# Altium footprint library IC.PcbLib: 386 footprints (part 6 of 30)
Each footprint in its own frame and in the unit in brackets; x right, y up, seen from the top. Pads: shape width x height; smd on the part's side, far side on the other; paste and mask are expansions set on the pad; w line width, h text height; cw(c..) or ccw(c..) is an arc to the next point about the centre after c.
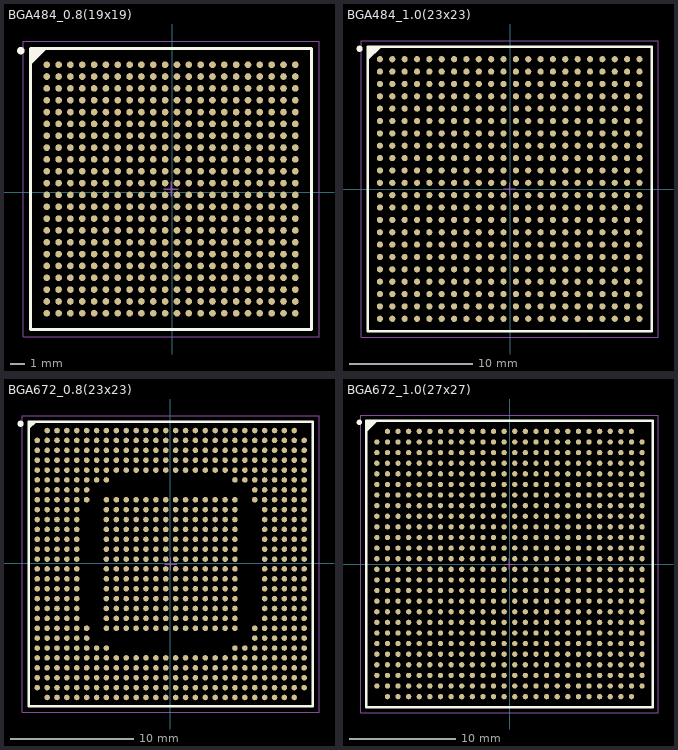
[diagram p5: the footprints below, top view; thin cyan lines are the x and y axes]

## BGA484_0.8(19x19) [mm]
height 1
pads (484):
  round 0.45 smd: A1(-8.476,8.603) A2(-7.676,8.603) A3(-6.876,8.603) A4(-6.076,8.603) A5(-5.276,8.603) A6(-4.476,8.603) A7(-3.676,8.603) A8(-2.876,8.603) A9(-2.076,8.603) A10(-1.276,8.603) A11(-0.476,8.603) A12(0.324,8.603) A13(1.124,8.603) A14(1.924,8.603) A15(2.724,8.603) A16(3.524,8.603) A17(4.324,8.603) A18(5.124,8.603) A19(5.924,8.603) A20(6.724,8.603) A21(7.524,8.603) A22(8.324,8.603) AA1(-8.476,-7.397) AA2(-7.676,-7.397) AA3(-6.876,-7.397) AA4(-6.076,-7.397) AA5(-5.276,-7.397) AA6(-4.476,-7.397) AA7(-3.676,-7.397) AA8(-2.876,-7.397) AA9(-2.076,-7.397) AA10(-1.276,-7.397) AA11(-0.476,-7.397) AA12(0.324,-7.397) AA13(1.124,-7.397) AA14(1.924,-7.397) AA15(2.724,-7.397) AA16(3.524,-7.397) AA17(4.324,-7.397) AA18(5.124,-7.397) AA19(5.924,-7.397) AA20(6.724,-7.397) AA21(7.524,-7.397) AA22(8.324,-7.397) AB1(-8.476,-8.197) AB2(-7.676,-8.197) AB3(-6.876,-8.197) AB4(-6.076,-8.197) AB5(-5.276,-8.197) AB6(-4.476,-8.197) AB7(-3.676,-8.197) AB8(-2.876,-8.197) AB9(-2.076,-8.197) AB10(-1.276,-8.197) AB11(-0.476,-8.197) AB12(0.324,-8.197) AB13(1.124,-8.197) AB14(1.924,-8.197) AB15(2.724,-8.197) AB16(3.524,-8.197) AB17(4.324,-8.197) AB18(5.124,-8.197) AB19(5.924,-8.197) AB20(6.724,-8.197) AB21(7.524,-8.197) AB22(8.324,-8.197) B1(-8.476,7.803) B2(-7.676,7.803) B3(-6.876,7.803) B4(-6.076,7.803) B5(-5.276,7.803) B6(-4.476,7.803) B7(-3.676,7.803) B8(-2.876,7.803) B9(-2.076,7.803) B10(-1.276,7.803) B11(-0.476,7.803) B12(0.324,7.803) B13(1.124,7.803) B14(1.924,7.803) B15(2.724,7.803) B16(3.524,7.803) B17(4.324,7.803) B18(5.124,7.803) B19(5.924,7.803) B20(6.724,7.803) B21(7.524,7.803) B22(8.324,7.803) C1(-8.476,7.003) C2(-7.676,7.003) C3(-6.876,7.003) C4(-6.076,7.003) C5(-5.276,7.003) C6(-4.476,7.003) C7(-3.676,7.003) C8(-2.876,7.003) C9(-2.076,7.003) C10(-1.276,7.003) C11(-0.476,7.003) C12(0.324,7.003) C13(1.124,7.003) C14(1.924,7.003) C15(2.724,7.003) C16(3.524,7.003) C17(4.324,7.003) C18(5.124,7.003) C19(5.924,7.003) C20(6.724,7.003) C21(7.524,7.003) C22(8.324,7.003) D1(-8.476,6.203) D2(-7.676,6.203) D3(-6.876,6.203) D4(-6.076,6.203) D5(-5.276,6.203) D6(-4.476,6.203) D7(-3.676,6.203) D8(-2.876,6.203) D9(-2.076,6.203) D10(-1.276,6.203) D11(-0.476,6.203) D12(0.324,6.203) D13(1.124,6.203) D14(1.924,6.203) D15(2.724,6.203) D16(3.524,6.203) D17(4.324,6.203) D18(5.124,6.203) D19(5.924,6.203) D20(6.724,6.203) D21(7.524,6.203) D22(8.324,6.203) E1(-8.476,5.403) E2(-7.676,5.403) E3(-6.876,5.403) E4(-6.076,5.403) E5(-5.276,5.403) E6(-4.476,5.403) E7(-3.676,5.403) E8(-2.876,5.403) E9(-2.076,5.403) E10(-1.276,5.403) E11(-0.476,5.403) E12(0.324,5.403) E13(1.124,5.403) E14(1.924,5.403) E15(2.724,5.403) E16(3.524,5.403) E17(4.324,5.403) E18(5.124,5.403) E19(5.924,5.403) E20(6.724,5.403) E21(7.524,5.403) E22(8.324,5.403) F1(-8.476,4.603) F2(-7.676,4.603) F3(-6.876,4.603) F4(-6.076,4.603) F5(-5.276,4.603) F6(-4.476,4.603) F7(-3.676,4.603) F8(-2.876,4.603) F9(-2.076,4.603) F10(-1.276,4.603) F11(-0.476,4.603) F12(0.324,4.603) F13(1.124,4.603) F14(1.924,4.603) F15(2.724,4.603) F16(3.524,4.603) F17(4.324,4.603) F18(5.124,4.603) F19(5.924,4.603) F20(6.724,4.603) F21(7.524,4.603) F22(8.324,4.603) G1(-8.476,3.803) G2(-7.676,3.803) G3(-6.876,3.803) G4(-6.076,3.803) G5(-5.276,3.803) G6(-4.476,3.803) G7(-3.676,3.803) G8(-2.876,3.803) G9(-2.076,3.803) G10(-1.276,3.803) G11(-0.476,3.803) G12(0.324,3.803) G13(1.124,3.803) G14(1.924,3.803) G15(2.724,3.803) G16(3.524,3.803) G17(4.324,3.803) G18(5.124,3.803) G19(5.924,3.803) G20(6.724,3.803) G21(7.524,3.803) G22(8.324,3.803) H1(-8.476,3.003) H2(-7.676,3.003) H3(-6.876,3.003) H4(-6.076,3.003) H5(-5.276,3.003) H6(-4.476,3.003) H7(-3.676,3.003) H8(-2.876,3.003) H9(-2.076,3.003) H10(-1.276,3.003) H11(-0.476,3.003) H12(0.324,3.003) H13(1.124,3.003) H14(1.924,3.003) H15(2.724,3.003) H16(3.524,3.003) H17(4.324,3.003) H18(5.124,3.003) H19(5.924,3.003) H20(6.724,3.003) H21(7.524,3.003) H22(8.324,3.003) J1(-8.476,2.203) J2(-7.676,2.203) J3(-6.876,2.203) J4(-6.076,2.203) J5(-5.276,2.203) J6(-4.476,2.203) J7(-3.676,2.203) J8(-2.876,2.203) J9(-2.076,2.203) J10(-1.276,2.203) J11(-0.476,2.203) J12(0.324,2.203) J13(1.124,2.203) J14(1.924,2.203) J15(2.724,2.203) J16(3.524,2.203) J17(4.324,2.203) J18(5.124,2.203) J19(5.924,2.203) J20(6.724,2.203) J21(7.524,2.203) J22(8.324,2.203) K1(-8.476,1.403) K2(-7.676,1.403) K3(-6.876,1.403) K4(-6.076,1.403) K5(-5.276,1.403) K6(-4.476,1.403) K7(-3.676,1.403) K8(-2.876,1.403) K9(-2.076,1.403) K10(-1.276,1.403) K11(-0.476,1.403) K12(0.324,1.403) K13(1.124,1.403) K14(1.924,1.403) K15(2.724,1.403) K16(3.524,1.403) K17(4.324,1.403) K18(5.124,1.403) K19(5.924,1.403) K20(6.724,1.403) K21(7.524,1.403) K22(8.324,1.403) L1(-8.476,0.603) L2(-7.676,0.603) L3(-6.876,0.603) L4(-6.076,0.603) L5(-5.276,0.603) L6(-4.476,0.603) L7(-3.676,0.603) L8(-2.876,0.603) L9(-2.076,0.603) L10(-1.276,0.603) L11(-0.476,0.603) L12(0.324,0.603) L13(1.124,0.603) L14(1.924,0.603) L15(2.724,0.603) L16(3.524,0.603) L17(4.324,0.603) L18(5.124,0.603) L19(5.924,0.603) L20(6.724,0.603) L21(7.524,0.603) L22(8.324,0.603) M1(-8.476,-0.197) M2(-7.676,-0.197) M3(-6.876,-0.197) M4(-6.076,-0.197) M5(-5.276,-0.197) M6(-4.476,-0.197) M7(-3.676,-0.197) M8(-2.876,-0.197) M9(-2.076,-0.197) M10(-1.276,-0.197) M11(-0.476,-0.197) M12(0.324,-0.197) M13(1.124,-0.197) M14(1.924,-0.197) M15(2.724,-0.197) M16(3.524,-0.197) M17(4.324,-0.197) M18(5.124,-0.197) M19(5.924,-0.197) M20(6.724,-0.197) M21(7.524,-0.197) M22(8.324,-0.197) N1(-8.476,-0.997) N2(-7.676,-0.997) N3(-6.876,-0.997) N4(-6.076,-0.997) N5(-5.276,-0.997) N6(-4.476,-0.997) N7(-3.676,-0.997) N8(-2.876,-0.997) N9(-2.076,-0.997) N10(-1.276,-0.997) N11(-0.476,-0.997) N12(0.324,-0.997) N13(1.124,-0.997) N14(1.924,-0.997) N15(2.724,-0.997) N16(3.524,-0.997) N17(4.324,-0.997) N18(5.124,-0.997) N19(5.924,-0.997) N20(6.724,-0.997) N21(7.524,-0.997) N22(8.324,-0.997) P1(-8.476,-1.797) P2(-7.676,-1.797) P3(-6.876,-1.797) P4(-6.076,-1.797) P5(-5.276,-1.797) P6(-4.476,-1.797) P7(-3.676,-1.797) P8(-2.876,-1.797) P9(-2.076,-1.797) P10(-1.276,-1.797) P11(-0.476,-1.797) P12(0.324,-1.797) P13(1.124,-1.797) P14(1.924,-1.797) P15(2.724,-1.797) P16(3.524,-1.797) P17(4.324,-1.797) P18(5.124,-1.797) P19(5.924,-1.797) P20(6.724,-1.797) P21(7.524,-1.797) P22(8.324,-1.797) R1(-8.476,-2.597) R2(-7.676,-2.597) R3(-6.876,-2.597) R4(-6.076,-2.597) R5(-5.276,-2.597) R6(-4.476,-2.597) R7(-3.676,-2.597) R8(-2.876,-2.597) R9(-2.076,-2.597) R10(-1.276,-2.597) R11(-0.476,-2.597) R12(0.324,-2.597) R13(1.124,-2.597) R14(1.924,-2.597) R15(2.724,-2.597) R16(3.524,-2.597) R17(4.324,-2.597) R18(5.124,-2.597) R19(5.924,-2.597) R20(6.724,-2.597) R21(7.524,-2.597) R22(8.324,-2.597) T1(-8.476,-3.397) T2(-7.676,-3.397) T3(-6.876,-3.397) T4(-6.076,-3.397) T5(-5.276,-3.397) T6(-4.476,-3.397) T7(-3.676,-3.397) T8(-2.876,-3.397) T9(-2.076,-3.397) T10(-1.276,-3.397) T11(-0.476,-3.397) T12(0.324,-3.397) T13(1.124,-3.397) T14(1.924,-3.397) T15(2.724,-3.397) T16(3.524,-3.397) T17(4.324,-3.397) T18(5.124,-3.397) T19(5.924,-3.397) T20(6.724,-3.397) T21(7.524,-3.397) T22(8.324,-3.397) U1(-8.476,-4.197) U2(-7.676,-4.197) U3(-6.876,-4.197) U4(-6.076,-4.197) U5(-5.276,-4.197) U6(-4.476,-4.197) U7(-3.676,-4.197) U8(-2.876,-4.197) U9(-2.076,-4.197) U10(-1.276,-4.197) U11(-0.476,-4.197) U12(0.324,-4.197) U13(1.124,-4.197) U14(1.924,-4.197) U15(2.724,-4.197) U16(3.524,-4.197) U17(4.324,-4.197) U18(5.124,-4.197) U19(5.924,-4.197) U20(6.724,-4.197) U21(7.524,-4.197) U22(8.324,-4.197) V1(-8.476,-4.997) V2(-7.676,-4.997) V3(-6.876,-4.997) V4(-6.076,-4.997) V5(-5.276,-4.997) V6(-4.476,-4.997) V7(-3.676,-4.997) V8(-2.876,-4.997) V9(-2.076,-4.997) V10(-1.276,-4.997) V11(-0.476,-4.997) V12(0.324,-4.997) V13(1.124,-4.997) V14(1.924,-4.997) V15(2.724,-4.997) V16(3.524,-4.997) V17(4.324,-4.997) V18(5.124,-4.997) V19(5.924,-4.997) V20(6.724,-4.997) V21(7.524,-4.997) V22(8.324,-4.997) W1(-8.476,-5.797) W2(-7.676,-5.797) W3(-6.876,-5.797) W4(-6.076,-5.797) W5(-5.276,-5.797) W6(-4.476,-5.797) W7(-3.676,-5.797) W8(-2.876,-5.797) W9(-2.076,-5.797) W10(-1.276,-5.797) W11(-0.476,-5.797) W12(0.324,-5.797) W13(1.124,-5.797) W14(1.924,-5.797) W15(2.724,-5.797) W16(3.524,-5.797) W17(4.324,-5.797) W18(5.124,-5.797) W19(5.924,-5.797) W20(6.724,-5.797) W21(7.524,-5.797) W22(8.324,-5.797) Y1(-8.476,-6.597) Y2(-7.676,-6.597) Y3(-6.876,-6.597) Y4(-6.076,-6.597) Y5(-5.276,-6.597) Y6(-4.476,-6.597) Y7(-3.676,-6.597) Y8(-2.876,-6.597) Y9(-2.076,-6.597) Y10(-1.276,-6.597) Y11(-0.476,-6.597) Y12(0.324,-6.597) Y13(1.124,-6.597) Y14(1.924,-6.597) Y15(2.724,-6.597) Y16(3.524,-6.597) Y17(4.324,-6.597) Y18(5.124,-6.597) Y19(5.924,-6.597) Y20(6.724,-6.597) Y21(7.524,-6.597) Y22(8.324,-6.597)
Top Overlay:
  circle w0.25: c-10.226,9.553 r0.125
  region: -8.576,9.703 -9.576,8.703 -9.576,9.703
  lines w0.2: -9.576,8.703 -8.576,9.703 ; -9.576,-9.297 9.424,-9.297 9.424,9.703 -9.576,9.703 -9.576,-9.297
Mechanical 13:
  lines w0.1: -9.576,-9.297 9.424,-9.297 9.424,9.703 -9.576,9.703 -9.576,-9.297
Mechanical 15:
  lines w0.05: -10.076,-9.797 9.924,-9.797 9.924,10.203 -10.076,10.203 -10.076,-9.797
  lines w0.1: -0.576,0.203 0.424,0.203 ; -0.076,-0.297 -0.076,0.703
3D body "User Library-XC7Z030-1SBG485I.step": height 2.29, standoff 0, extent -9.551,-9.297 9.449,9.703

## BGA484_1.0(23x23) [mm]
pads (484):
  round 0.5 smd: A1(-10.525,10.525) A2(-9.525,10.525) A3(-8.525,10.525) A4(-7.525,10.525) A5(-6.525,10.525) A6(-5.525,10.525) A7(-4.525,10.525) A8(-3.525,10.525) A9(-2.525,10.525) A10(-1.525,10.525) A11(-0.525,10.525) A12(0.475,10.525) A13(1.475,10.525) A14(2.475,10.525) A15(3.475,10.525) A16(4.475,10.525) A17(5.475,10.525) A18(6.475,10.525) A19(7.475,10.525) A20(8.475,10.525) A21(9.475,10.525) A22(10.475,10.525) AA1(-10.525,-9.475) AA2(-9.525,-9.475) AA3(-8.525,-9.475) AA4(-7.525,-9.475) AA5(-6.525,-9.475) AA6(-5.525,-9.475) AA7(-4.525,-9.475) AA8(-3.525,-9.475) AA9(-2.525,-9.475) AA10(-1.525,-9.475) AA11(-0.525,-9.475) AA12(0.475,-9.475) AA13(1.475,-9.475) AA14(2.475,-9.475) AA15(3.475,-9.475) AA16(4.475,-9.475) AA17(5.475,-9.475) AA18(6.475,-9.475) AA19(7.475,-9.475) AA20(8.475,-9.475) AA21(9.475,-9.475) AA22(10.475,-9.475) AB1(-10.525,-10.475) AB2(-9.525,-10.475) AB3(-8.525,-10.475) AB4(-7.525,-10.475) AB5(-6.525,-10.475) AB6(-5.525,-10.475) AB7(-4.525,-10.475) AB8(-3.525,-10.475) AB9(-2.525,-10.475) AB10(-1.525,-10.475) AB11(-0.525,-10.475) AB12(0.475,-10.475) AB13(1.475,-10.475) AB14(2.475,-10.475) AB15(3.475,-10.475) AB16(4.475,-10.475) AB17(5.475,-10.475) AB18(6.475,-10.475) AB19(7.475,-10.475) AB20(8.475,-10.475) AB21(9.475,-10.475) AB22(10.475,-10.475) B1(-10.525,9.525) B2(-9.525,9.525) B3(-8.525,9.525) B4(-7.525,9.525) B5(-6.525,9.525) B6(-5.525,9.525) B7(-4.525,9.525) B8(-3.525,9.525) B9(-2.525,9.525) B10(-1.525,9.525) B11(-0.525,9.525) B12(0.475,9.525) B13(1.475,9.525) B14(2.475,9.525) B15(3.475,9.525) B16(4.475,9.525) B17(5.475,9.525) B18(6.475,9.525) B19(7.475,9.525) B20(8.475,9.525) B21(9.475,9.525) B22(10.475,9.525) C1(-10.525,8.525) C2(-9.525,8.525) C3(-8.525,8.525) C4(-7.525,8.525) C5(-6.525,8.525) C6(-5.525,8.525) C7(-4.525,8.525) C8(-3.525,8.525) C9(-2.525,8.525) C10(-1.525,8.525) C11(-0.525,8.525) C12(0.475,8.525) C13(1.475,8.525) C14(2.475,8.525) C15(3.475,8.525) C16(4.475,8.525) C17(5.475,8.525) C18(6.475,8.525) C19(7.475,8.525) C20(8.475,8.525) C21(9.475,8.525) C22(10.475,8.525) D1(-10.525,7.525) D2(-9.525,7.525) D3(-8.525,7.525) D4(-7.525,7.525) D5(-6.525,7.525) D6(-5.525,7.525) D7(-4.525,7.525) D8(-3.525,7.525) D9(-2.525,7.525) D10(-1.525,7.525) D11(-0.525,7.525) D12(0.475,7.525) D13(1.475,7.525) D14(2.475,7.525) D15(3.475,7.525) D16(4.475,7.525) D17(5.475,7.525) D18(6.475,7.525) D19(7.475,7.525) D20(8.475,7.525) D21(9.475,7.525) D22(10.475,7.525) E1(-10.525,6.525) E2(-9.525,6.525) E3(-8.525,6.525) E4(-7.525,6.525) E5(-6.525,6.525) E6(-5.525,6.525) E7(-4.525,6.525) E8(-3.525,6.525) E9(-2.525,6.525) E10(-1.525,6.525) E11(-0.525,6.525) E12(0.475,6.525) E13(1.475,6.525) E14(2.475,6.525) E15(3.475,6.525) E16(4.475,6.525) E17(5.475,6.525) E18(6.475,6.525) E19(7.475,6.525) E20(8.475,6.525) E21(9.475,6.525) E22(10.475,6.525) F1(-10.525,5.525) F2(-9.525,5.525) F3(-8.525,5.525) F4(-7.525,5.525) F5(-6.525,5.525) F6(-5.525,5.525) F7(-4.525,5.525) F8(-3.525,5.525) F9(-2.525,5.525) F10(-1.525,5.525) F11(-0.525,5.525) F12(0.475,5.525) F13(1.475,5.525) F14(2.475,5.525) F15(3.475,5.525) F16(4.475,5.525) F17(5.475,5.525) F18(6.475,5.525) F19(7.475,5.525) F20(8.475,5.525) F21(9.475,5.525) F22(10.475,5.525) G1(-10.525,4.525) G2(-9.525,4.525) G3(-8.525,4.525) G4(-7.525,4.525) G5(-6.525,4.525) G6(-5.525,4.525) G7(-4.525,4.525) G8(-3.525,4.525) G9(-2.525,4.525) G10(-1.525,4.525) G11(-0.525,4.525) G12(0.475,4.525) G13(1.475,4.525) G14(2.475,4.525) G15(3.475,4.525) G16(4.475,4.525) G17(5.475,4.525) G18(6.475,4.525) G19(7.475,4.525) G20(8.475,4.525) G21(9.475,4.525) G22(10.475,4.525) H1(-10.525,3.525) H2(-9.525,3.525) H3(-8.525,3.525) H4(-7.525,3.525) H5(-6.525,3.525) H6(-5.525,3.525) H7(-4.525,3.525) H8(-3.525,3.525) H9(-2.525,3.525) H10(-1.525,3.525) H11(-0.525,3.525) H12(0.475,3.525) H13(1.475,3.525) H14(2.475,3.525) H15(3.475,3.525) H16(4.475,3.525) H17(5.475,3.525) H18(6.475,3.525) H19(7.475,3.525) H20(8.475,3.525) H21(9.475,3.525) H22(10.475,3.525) J1(-10.525,2.525) J2(-9.525,2.525) J3(-8.525,2.525) J4(-7.525,2.525) J5(-6.525,2.525) J6(-5.525,2.525) J7(-4.525,2.525) J8(-3.525,2.525) J9(-2.525,2.525) J10(-1.525,2.525) J11(-0.525,2.525) J12(0.475,2.525) J13(1.475,2.525) J14(2.475,2.525) J15(3.475,2.525) J16(4.475,2.525) J17(5.475,2.525) J18(6.475,2.525) J19(7.475,2.525) J20(8.475,2.525) J21(9.475,2.525) J22(10.475,2.525) K1(-10.525,1.525) K2(-9.525,1.525) K3(-8.525,1.525) K4(-7.525,1.525) K5(-6.525,1.525) K6(-5.525,1.525) K7(-4.525,1.525) K8(-3.525,1.525) K9(-2.525,1.525) K10(-1.525,1.525) K11(-0.525,1.525) K12(0.475,1.525) K13(1.475,1.525) K14(2.475,1.525) K15(3.475,1.525) K16(4.475,1.525) K17(5.475,1.525) K18(6.475,1.525) K19(7.475,1.525) K20(8.475,1.525) K21(9.475,1.525) K22(10.475,1.525) L1(-10.525,0.525) L2(-9.525,0.525) L3(-8.525,0.525) L4(-7.525,0.525) L5(-6.525,0.525) L6(-5.525,0.525) L7(-4.525,0.525) L8(-3.525,0.525) L9(-2.525,0.525) L10(-1.525,0.525) L11(-0.525,0.525) L12(0.475,0.525) L13(1.475,0.525) L14(2.475,0.525) L15(3.475,0.525) L16(4.475,0.525) L17(5.475,0.525) L18(6.475,0.525) L19(7.475,0.525) L20(8.475,0.525) L21(9.475,0.525) L22(10.475,0.525) M1(-10.525,-0.475) M2(-9.525,-0.475) M3(-8.525,-0.475) M4(-7.525,-0.475) M5(-6.525,-0.475) M6(-5.525,-0.475) M7(-4.525,-0.475) M8(-3.525,-0.475) M9(-2.525,-0.475) M10(-1.525,-0.475) M11(-0.525,-0.475) M12(0.475,-0.475) M13(1.475,-0.475) M14(2.475,-0.475) M15(3.475,-0.475) M16(4.475,-0.475) M17(5.475,-0.475) M18(6.475,-0.475) M19(7.475,-0.475) M20(8.475,-0.475) M21(9.475,-0.475) M22(10.475,-0.475) N1(-10.525,-1.475) N2(-9.525,-1.475) N3(-8.525,-1.475) N4(-7.525,-1.475) N5(-6.525,-1.475) N6(-5.525,-1.475) N7(-4.525,-1.475) N8(-3.525,-1.475) N9(-2.525,-1.475) N10(-1.525,-1.475) N11(-0.525,-1.475) N12(0.475,-1.475) N13(1.475,-1.475) N14(2.475,-1.475) N15(3.475,-1.475) N16(4.475,-1.475) N17(5.475,-1.475) N18(6.475,-1.475) N19(7.475,-1.475) N20(8.475,-1.475) N21(9.475,-1.475) N22(10.475,-1.475) P1(-10.525,-2.475) P2(-9.525,-2.475) P3(-8.525,-2.475) P4(-7.525,-2.475) P5(-6.525,-2.475) P6(-5.525,-2.475) P7(-4.525,-2.475) P8(-3.525,-2.475) P9(-2.525,-2.475) P10(-1.525,-2.475) P11(-0.525,-2.475) P12(0.475,-2.475) P13(1.475,-2.475) P14(2.475,-2.475) P15(3.475,-2.475) P16(4.475,-2.475) P17(5.475,-2.475) P18(6.475,-2.475) P19(7.475,-2.475) P20(8.475,-2.475) P21(9.475,-2.475) P22(10.475,-2.475) R1(-10.525,-3.475) R2(-9.525,-3.475) R3(-8.525,-3.475) R4(-7.525,-3.475) R5(-6.525,-3.475) R6(-5.525,-3.475) R7(-4.525,-3.475) R8(-3.525,-3.475) R9(-2.525,-3.475) R10(-1.525,-3.475) R11(-0.525,-3.475) R12(0.475,-3.475) R13(1.475,-3.475) R14(2.475,-3.475) R15(3.475,-3.475) R16(4.475,-3.475) R17(5.475,-3.475) R18(6.475,-3.475) R19(7.475,-3.475) R20(8.475,-3.475) R21(9.475,-3.475) R22(10.475,-3.475) T1(-10.525,-4.475) T2(-9.525,-4.475) T3(-8.525,-4.475) T4(-7.525,-4.475) T5(-6.525,-4.475) T6(-5.525,-4.475) T7(-4.525,-4.475) T8(-3.525,-4.475) T9(-2.525,-4.475) T10(-1.525,-4.475) T11(-0.525,-4.475) T12(0.475,-4.475) T13(1.475,-4.475) T14(2.475,-4.475) T15(3.475,-4.475) T16(4.475,-4.475) T17(5.475,-4.475) T18(6.475,-4.475) T19(7.475,-4.475) T20(8.475,-4.475) T21(9.475,-4.475) T22(10.475,-4.475) U1(-10.525,-5.475) U2(-9.525,-5.475) U3(-8.525,-5.475) U4(-7.525,-5.475) U5(-6.525,-5.475) U6(-5.525,-5.475) U7(-4.525,-5.475) U8(-3.525,-5.475) U9(-2.525,-5.475) U10(-1.525,-5.475) U11(-0.525,-5.475) U12(0.475,-5.475) U13(1.475,-5.475) U14(2.475,-5.475) U15(3.475,-5.475) U16(4.475,-5.475) U17(5.475,-5.475) U18(6.475,-5.475) U19(7.475,-5.475) U20(8.475,-5.475) U21(9.475,-5.475) U22(10.475,-5.475) V1(-10.525,-6.475) V2(-9.525,-6.475) V3(-8.525,-6.475) V4(-7.525,-6.475) V5(-6.525,-6.475) V6(-5.525,-6.475) V7(-4.525,-6.475) V8(-3.525,-6.475) V9(-2.525,-6.475) V10(-1.525,-6.475) V11(-0.525,-6.475) V12(0.475,-6.475) V13(1.475,-6.475) V14(2.475,-6.475) V15(3.475,-6.475) V16(4.475,-6.475) V17(5.475,-6.475) V18(6.475,-6.475) V19(7.475,-6.475) V20(8.475,-6.475) V21(9.475,-6.475) V22(10.475,-6.475) W1(-10.525,-7.475) W2(-9.525,-7.475) W3(-8.525,-7.475) W4(-7.525,-7.475) W5(-6.525,-7.475) W6(-5.525,-7.475) W7(-4.525,-7.475) W8(-3.525,-7.475) W9(-2.525,-7.475) W10(-1.525,-7.475) W11(-0.525,-7.475) W12(0.475,-7.475) W13(1.475,-7.475) W14(2.475,-7.475) W15(3.475,-7.475) W16(4.475,-7.475) W17(5.475,-7.475) W18(6.475,-7.475) W19(7.475,-7.475) W20(8.475,-7.475) W21(9.475,-7.475) W22(10.475,-7.475) Y1(-10.525,-8.475) Y2(-9.525,-8.475) Y3(-8.525,-8.475) Y4(-7.525,-8.475) Y5(-6.525,-8.475) Y6(-5.525,-8.475) Y7(-4.525,-8.475) Y8(-3.525,-8.475) Y9(-2.525,-8.475) Y10(-1.525,-8.475) Y11(-0.525,-8.475) Y12(0.475,-8.475) Y13(1.475,-8.475) Y14(2.475,-8.475) Y15(3.475,-8.475) Y16(4.475,-8.475) Y17(5.475,-8.475) Y18(6.475,-8.475) Y19(7.475,-8.475) Y20(8.475,-8.475) Y21(9.475,-8.475) Y22(10.475,-8.475)
Top Overlay:
  circle w0.25: c-12.175,11.375 r0.125
  region: -10.525,11.525 -11.525,10.525 -11.525,11.525
  lines w0.2: -11.525,10.525 -10.525,11.525 ; -11.525,-11.475 -11.525,11.525 11.475,11.525 11.475,-11.475 -11.525,-11.475
Mechanical 13:
  lines w0.1: -11.525,-11.475 -11.525,11.525 11.475,11.525 11.475,-11.475 -11.525,-11.475
Mechanical 15:
  lines w0.05: -12.025,-11.975 -12.025,12.025 11.975,12.025 11.975,-11.975 -12.025,-11.975
  lines w0.1: -0.525,0.025 0.475,0.025 ; -0.025,-0.475 -0.025,0.525
3D body "User Library-FBGA484.step": height 2.52, standoff 0.02, extent -11.5,-11.449 11.5,11.551

## BGA672_0.8(23x23) [mm]
pads (672):
  round 0.45 smd: A2(-9.949,10.749) A3(-9.149,10.749) A4(-8.349,10.749) A5(-7.549,10.749) A6(-6.749,10.749) A7(-5.949,10.749) A8(-5.149,10.749) A9(-4.349,10.749) A10(-3.549,10.749) A11(-2.749,10.749) A12(-1.949,10.749) A13(-1.149,10.749) A14(-0.349,10.749) A15(0.451,10.749) A16(1.251,10.749) A17(2.051,10.749) A18(2.851,10.749) A19(3.651,10.749) A20(4.451,10.749) A21(5.251,10.749) A22(6.051,10.749) A23(6.851,10.749) A24(7.651,10.749) A25(8.451,10.749) A26(9.251,10.749) A27(10.051,10.749) AA1(-10.749,-5.251) AA2(-9.949,-5.251) AA3(-9.149,-5.251) AA4(-8.349,-5.251) AA5(-7.549,-5.251) AA6(-6.749,-5.251) AA8(-5.149,-5.251) AA9(-4.349,-5.251) AA10(-3.549,-5.251) AA11(-2.749,-5.251) AA12(-1.949,-5.251) AA13(-1.149,-5.251) AA14(-0.349,-5.251) AA15(0.451,-5.251) AA16(1.251,-5.251) AA17(2.051,-5.251) AA18(2.851,-5.251) AA19(3.651,-5.251) AA20(4.451,-5.251) AA21(5.251,-5.251) AA23(6.851,-5.251) AA24(7.651,-5.251) AA25(8.451,-5.251) AA26(9.251,-5.251) AA27(10.051,-5.251) AA28(10.851,-5.251) AB1(-10.749,-6.051) AB2(-9.949,-6.051) AB3(-9.149,-6.051) AB4(-8.349,-6.051) AB5(-7.549,-6.051) AB6(-6.749,-6.051) AB23(6.851,-6.051) AB24(7.651,-6.051) AB25(8.451,-6.051) AB26(9.251,-6.051) AB27(10.051,-6.051) AB28(10.851,-6.051) AC1(-10.749,-6.851) AC2(-9.949,-6.851) AC3(-9.149,-6.851) AC4(-8.349,-6.851) AC5(-7.549,-6.851) AC6(-6.749,-6.851) AC7(-5.949,-6.851) AC8(-5.149,-6.851) AC21(5.251,-6.851) AC22(6.051,-6.851) AC23(6.851,-6.851) AC24(7.651,-6.851) AC25(8.451,-6.851) AC26(9.251,-6.851) AC27(10.051,-6.851) AC28(10.851,-6.851) AD1(-10.749,-7.651) AD2(-9.949,-7.651) AD3(-9.149,-7.651) AD4(-8.349,-7.651) AD5(-7.549,-7.651) AD6(-6.749,-7.651) AD7(-5.949,-7.651) AD8(-5.149,-7.651) AD9(-4.349,-7.651) AD10(-3.549,-7.651) AD11(-2.749,-7.651) AD12(-1.949,-7.651) AD13(-1.149,-7.651) AD14(-0.349,-7.651) AD15(0.451,-7.651) AD16(1.251,-7.651) AD17(2.051,-7.651) AD18(2.851,-7.651) AD19(3.651,-7.651) AD20(4.451,-7.651) AD21(5.251,-7.651) AD22(6.051,-7.651) AD23(6.851,-7.651) AD24(7.651,-7.651) AD25(8.451,-7.651) AD26(9.251,-7.651) AD27(10.051,-7.651) AD28(10.851,-7.651) AE1(-10.749,-8.451) AE2(-9.949,-8.451) AE3(-9.149,-8.451) AE4(-8.349,-8.451) AE5(-7.549,-8.451) AE6(-6.749,-8.451) AE7(-5.949,-8.451) AE8(-5.149,-8.451) AE9(-4.349,-8.451) AE10(-3.549,-8.451) AE11(-2.749,-8.451) AE12(-1.949,-8.451) AE13(-1.149,-8.451) AE14(-0.349,-8.451) AE15(0.451,-8.451) AE16(1.251,-8.451) AE17(2.051,-8.451) AE18(2.851,-8.451) AE19(3.651,-8.451) AE20(4.451,-8.451) AE21(5.251,-8.451) AE22(6.051,-8.451) AE23(6.851,-8.451) AE24(7.651,-8.451) AE25(8.451,-8.451) AE26(9.251,-8.451) AE27(10.051,-8.451) AE28(10.851,-8.451) AF1(-10.749,-9.251) AF2(-9.949,-9.251) AF3(-9.149,-9.251) AF4(-8.349,-9.251) AF5(-7.549,-9.251) AF6(-6.749,-9.251) AF7(-5.949,-9.251) AF8(-5.149,-9.251) AF9(-4.349,-9.251) AF10(-3.549,-9.251) AF11(-2.749,-9.251) AF12(-1.949,-9.251) AF13(-1.149,-9.251) AF14(-0.349,-9.251) AF15(0.451,-9.251) AF16(1.251,-9.251) AF17(2.051,-9.251) AF18(2.851,-9.251) AF19(3.651,-9.251) AF20(4.451,-9.251) AF21(5.251,-9.251) AF22(6.051,-9.251) AF23(6.851,-9.251) AF24(7.651,-9.251) AF25(8.451,-9.251) AF26(9.251,-9.251) AF27(10.051,-9.251) AF28(10.851,-9.251) AG1(-10.749,-10.051) AG2(-9.949,-10.051) AG3(-9.149,-10.051) AG4(-8.349,-10.051) AG5(-7.549,-10.051) AG6(-6.749,-10.051) AG7(-5.949,-10.051) AG8(-5.149,-10.051) AG9(-4.349,-10.051) AG10(-3.549,-10.051) AG11(-2.749,-10.051) AG12(-1.949,-10.051) AG13(-1.149,-10.051) AG14(-0.349,-10.051) AG15(0.451,-10.051) AG16(1.251,-10.051) AG17(2.051,-10.051) AG18(2.851,-10.051) AG19(3.651,-10.051) AG20(4.451,-10.051) AG21(5.251,-10.051) AG22(6.051,-10.051) AG23(6.851,-10.051) AG24(7.651,-10.051) AG25(8.451,-10.051) AG26(9.251,-10.051) AG27(10.051,-10.051) AG28(10.851,-10.051) AH2(-9.949,-10.851) AH3(-9.149,-10.851) AH4(-8.349,-10.851) AH5(-7.549,-10.851) AH6(-6.749,-10.851) AH7(-5.949,-10.851) AH8(-5.149,-10.851) AH9(-4.349,-10.851) AH10(-3.549,-10.851) AH11(-2.749,-10.851) AH12(-1.949,-10.851) AH13(-1.149,-10.851) AH14(-0.349,-10.851) AH15(0.451,-10.851) AH16(1.251,-10.851) AH17(2.051,-10.851) AH18(2.851,-10.851) AH19(3.651,-10.851) AH20(4.451,-10.851) AH21(5.251,-10.851) AH22(6.051,-10.851) AH23(6.851,-10.851) AH24(7.651,-10.851) AH25(8.451,-10.851) AH26(9.251,-10.851) AH27(10.051,-10.851) B1(-10.749,9.949) B2(-9.949,9.949) B3(-9.149,9.949) B4(-8.349,9.949) B5(-7.549,9.949) B6(-6.749,9.949) B7(-5.949,9.949) B8(-5.149,9.949) B9(-4.349,9.949) B10(-3.549,9.949) B11(-2.749,9.949) B12(-1.949,9.949) B13(-1.149,9.949) B14(-0.349,9.949) B15(0.451,9.949) B16(1.251,9.949) B17(2.051,9.949) B18(2.851,9.949) B19(3.651,9.949) B20(4.451,9.949) B21(5.251,9.949) B22(6.051,9.949) B23(6.851,9.949) B24(7.651,9.949) B25(8.451,9.949) B26(9.251,9.949) B27(10.051,9.949) B28(10.851,9.949) C1(-10.749,9.149) C2(-9.949,9.149) C3(-9.149,9.149) C4(-8.349,9.149) C5(-7.549,9.149) C6(-6.749,9.149) C7(-5.949,9.149) C8(-5.149,9.149) C9(-4.349,9.149) C10(-3.549,9.149) C11(-2.749,9.149) C12(-1.949,9.149) C13(-1.149,9.149) C14(-0.349,9.149) C15(0.451,9.149) C16(1.251,9.149) C17(2.051,9.149) C18(2.851,9.149) C19(3.651,9.149) C20(4.451,9.149) C21(5.251,9.149) C22(6.051,9.149) C23(6.851,9.149) C24(7.651,9.149) C25(8.451,9.149) C26(9.251,9.149) C27(10.051,9.149) C28(10.851,9.149) D1(-10.749,8.349) D2(-9.949,8.349) D3(-9.149,8.349) D4(-8.349,8.349) D5(-7.549,8.349) D6(-6.749,8.349) D7(-5.949,8.349) D8(-5.149,8.349) D9(-4.349,8.349) D10(-3.549,8.349) D11(-2.749,8.349) D12(-1.949,8.349) D13(-1.149,8.349) D14(-0.349,8.349) D15(0.451,8.349) D16(1.251,8.349) D17(2.051,8.349) D18(2.851,8.349) D19(3.651,8.349) D20(4.451,8.349) D21(5.251,8.349) D22(6.051,8.349) D23(6.851,8.349) D24(7.651,8.349) D25(8.451,8.349) D26(9.251,8.349) D27(10.051,8.349) D28(10.851,8.349) E1(-10.749,7.549) E2(-9.949,7.549) E3(-9.149,7.549) E4(-8.349,7.549) E5(-7.549,7.549) E6(-6.749,7.549) E7(-5.949,7.549) E8(-5.149,7.549) E9(-4.349,7.549) E10(-3.549,7.549) E11(-2.749,7.549) E12(-1.949,7.549) E13(-1.149,7.549) E14(-0.349,7.549) E15(0.451,7.549) E16(1.251,7.549) E17(2.051,7.549) E18(2.851,7.549) E19(3.651,7.549) E20(4.451,7.549) E21(5.251,7.549) E22(6.051,7.549) E23(6.851,7.549) E24(7.651,7.549) E25(8.451,7.549) E26(9.251,7.549) E27(10.051,7.549) E28(10.851,7.549) F1(-10.749,6.749) F2(-9.949,6.749) F3(-9.149,6.749) F4(-8.349,6.749) F5(-7.549,6.749) F6(-6.749,6.749) F7(-5.949,6.749) F8(-5.149,6.749) F21(5.251,6.749) F22(6.051,6.749) F23(6.851,6.749) F24(7.651,6.749) F25(8.451,6.749) F26(9.251,6.749) F27(10.051,6.749) F28(10.851,6.749) G1(-10.749,5.949) G2(-9.949,5.949) G3(-9.149,5.949) G4(-8.349,5.949) G5(-7.549,5.949) G6(-6.749,5.949) G23(6.851,5.949) G24(7.651,5.949) G25(8.451,5.949) G26(9.251,5.949) G27(10.051,5.949) G28(10.851,5.949) H1(-10.749,5.149) H2(-9.949,5.149) H3(-9.149,5.149) H4(-8.349,5.149) H5(-7.549,5.149) H6(-6.749,5.149) H8(-5.149,5.149) H9(-4.349,5.149) H10(-3.549,5.149) H11(-2.749,5.149) H12(-1.949,5.149) H13(-1.149,5.149) H14(-0.349,5.149) H15(0.451,5.149) H16(1.251,5.149) H17(2.051,5.149) H18(2.851,5.149) H19(3.651,5.149) H20(4.451,5.149) H21(5.251,5.149) H23(6.851,5.149) H24(7.651,5.149) H25(8.451,5.149) H26(9.251,5.149) H27(10.051,5.149) H28(10.851,5.149) J1(-10.749,4.349) J2(-9.949,4.349) J3(-9.149,4.349) J4(-8.349,4.349) J5(-7.549,4.349) J8(-5.149,4.349) J9(-4.349,4.349) J10(-3.549,4.349) J11(-2.749,4.349) J12(-1.949,4.349) J13(-1.149,4.349) J14(-0.349,4.349) J15(0.451,4.349) J16(1.251,4.349) J17(2.051,4.349) J18(2.851,4.349) J19(3.651,4.349) J20(4.451,4.349) J21(5.251,4.349) J24(7.651,4.349) J25(8.451,4.349) J26(9.251,4.349) J27(10.051,4.349) J28(10.851,4.349) K1(-10.749,3.549) K2(-9.949,3.549) K3(-9.149,3.549) K4(-8.349,3.549) K5(-7.549,3.549) K8(-5.149,3.549) K9(-4.349,3.549) K10(-3.549,3.549) K11(-2.749,3.549) K12(-1.949,3.549) K13(-1.149,3.549) K14(-0.349,3.549) K15(0.451,3.549) K16(1.251,3.549) K17(2.051,3.549) K18(2.851,3.549) K19(3.651,3.549) K20(4.451,3.549) K21(5.251,3.549) K24(7.651,3.549) K25(8.451,3.549) K26(9.251,3.549) K27(10.051,3.549) K28(10.851,3.549) L1(-10.749,2.749) L2(-9.949,2.749) L3(-9.149,2.749) L4(-8.349,2.749) L5(-7.549,2.749) L8(-5.149,2.749) L9(-4.349,2.749) L10(-3.549,2.749) L11(-2.749,2.749) L12(-1.949,2.749) L13(-1.149,2.749) L14(-0.349,2.749) L15(0.451,2.749) L16(1.251,2.749) L17(2.051,2.749) L18(2.851,2.749) L19(3.651,2.749) L20(4.451,2.749) L21(5.251,2.749) L24(7.651,2.749) L25(8.451,2.749) L26(9.251,2.749) L27(10.051,2.749) L28(10.851,2.749) M1(-10.749,1.949) M2(-9.949,1.949) M3(-9.149,1.949) M4(-8.349,1.949) M5(-7.549,1.949) M8(-5.149,1.949) M9(-4.349,1.949) M10(-3.549,1.949) M11(-2.749,1.949) M12(-1.949,1.949) M13(-1.149,1.949) M14(-0.349,1.949) M15(0.451,1.949) M16(1.251,1.949) M17(2.051,1.949) M18(2.851,1.949) M19(3.651,1.949) M20(4.451,1.949) M21(5.251,1.949) M24(7.651,1.949) M25(8.451,1.949) M26(9.251,1.949) M27(10.051,1.949) M28(10.851,1.949) N1(-10.749,1.149) N2(-9.949,1.149) N3(-9.149,1.149) N4(-8.349,1.149) N5(-7.549,1.149) N8(-5.149,1.149) N9(-4.349,1.149) N10(-3.549,1.149) N11(-2.749,1.149) N12(-1.949,1.149) N13(-1.149,1.149) N14(-0.349,1.149) N15(0.451,1.149) N16(1.251,1.149) N17(2.051,1.149) N18(2.851,1.149) N19(3.651,1.149) N20(4.451,1.149) N21(5.251,1.149) N24(7.651,1.149) N25(8.451,1.149) N26(9.251,1.149) N27(10.051,1.149) N28(10.851,1.149) P1(-10.749,0.349) P2(-9.949,0.349) P3(-9.149,0.349) P4(-8.349,0.349) P5(-7.549,0.349) P8(-5.149,0.349) P9(-4.349,0.349) P10(-3.549,0.349) P11(-2.749,0.349) P12(-1.949,0.349) P13(-1.149,0.349) P14(-0.349,0.349) P15(0.451,0.349) P16(1.251,0.349) P17(2.051,0.349) P18(2.851,0.349) P19(3.651,0.349) P20(4.451,0.349) P21(5.251,0.349) P24(7.651,0.349) P25(8.451,0.349) P26(9.251,0.349) P27(10.051,0.349) P28(10.851,0.349) R1(-10.749,-0.451) R2(-9.949,-0.451) R3(-9.149,-0.451) R4(-8.349,-0.451) R5(-7.549,-0.451) R8(-5.149,-0.451) R9(-4.349,-0.451) R10(-3.549,-0.451) R11(-2.749,-0.451) R12(-1.949,-0.451) R13(-1.149,-0.451) R14(-0.349,-0.451) R15(0.451,-0.451) R16(1.251,-0.451) R17(2.051,-0.451) R18(2.851,-0.451) R19(3.651,-0.451) R20(4.451,-0.451) R21(5.251,-0.451) R24(7.651,-0.451) R25(8.451,-0.451) R26(9.251,-0.451) R27(10.051,-0.451) R28(10.851,-0.451) T1(-10.749,-1.251) T2(-9.949,-1.251) T3(-9.149,-1.251) T4(-8.349,-1.251) T5(-7.549,-1.251) T8(-5.149,-1.251) T9(-4.349,-1.251) T10(-3.549,-1.251) T11(-2.749,-1.251) T12(-1.949,-1.251) T13(-1.149,-1.251) T14(-0.349,-1.251) T15(0.451,-1.251) T16(1.251,-1.251) T17(2.051,-1.251) T18(2.851,-1.251) T19(3.651,-1.251) T20(4.451,-1.251) T21(5.251,-1.251) T24(7.651,-1.251) T25(8.451,-1.251) T26(9.251,-1.251) T27(10.051,-1.251) T28(10.851,-1.251) U1(-10.749,-2.051) U2(-9.949,-2.051) U3(-9.149,-2.051) U4(-8.349,-2.051) U5(-7.549,-2.051) U8(-5.149,-2.051) U9(-4.349,-2.051) U10(-3.549,-2.051) U11(-2.749,-2.051) U12(-1.949,-2.051) U13(-1.149,-2.051) U14(-0.349,-2.051) U15(0.451,-2.051) U16(1.251,-2.051) U17(2.051,-2.051) U18(2.851,-2.051) U19(3.651,-2.051) U20(4.451,-2.051) U21(5.251,-2.051) U24(7.651,-2.051) U25(8.451,-2.051) U26(9.251,-2.051) U27(10.051,-2.051) U28(10.851,-2.051) V1(-10.749,-2.851) V2(-9.949,-2.851) V3(-9.149,-2.851) V4(-8.349,-2.851) V5(-7.549,-2.851) V8(-5.149,-2.851) V9(-4.349,-2.851) V10(-3.549,-2.851) V11(-2.749,-2.851) V12(-1.949,-2.851) V13(-1.149,-2.851) V14(-0.349,-2.851) V15(0.451,-2.851) V16(1.251,-2.851) V17(2.051,-2.851) V18(2.851,-2.851) V19(3.651,-2.851) V20(4.451,-2.851) V21(5.251,-2.851) V24(7.651,-2.851) V25(8.451,-2.851) V26(9.251,-2.851) V27(10.051,-2.851) V28(10.851,-2.851) W1(-10.749,-3.651) W2(-9.949,-3.651) W3(-9.149,-3.651) W4(-8.349,-3.651) W5(-7.549,-3.651) W8(-5.149,-3.651) W9(-4.349,-3.651) W10(-3.549,-3.651) W11(-2.749,-3.651) W12(-1.949,-3.651) W13(-1.149,-3.651) W14(-0.349,-3.651) W15(0.451,-3.651) W16(1.251,-3.651) W17(2.051,-3.651) W18(2.851,-3.651) W19(3.651,-3.651) W20(4.451,-3.651) W21(5.251,-3.651) W24(7.651,-3.651) W25(8.451,-3.651) W26(9.251,-3.651) W27(10.051,-3.651) W28(10.851,-3.651) Y1(-10.749,-4.451) Y2(-9.949,-4.451) Y3(-9.149,-4.451) Y4(-8.349,-4.451) Y5(-7.549,-4.451) Y8(-5.149,-4.451) Y9(-4.349,-4.451) Y10(-3.549,-4.451) Y11(-2.749,-4.451) Y12(-1.949,-4.451) Y13(-1.149,-4.451) Y14(-0.349,-4.451) Y15(0.451,-4.451) Y16(1.251,-4.451) Y17(2.051,-4.451) Y18(2.851,-4.451) Y19(3.651,-4.451) Y20(4.451,-4.451) Y21(5.251,-4.451) Y24(7.651,-4.451) Y25(8.451,-4.451) Y26(9.251,-4.451) Y27(10.051,-4.451) Y28(10.851,-4.451)
Top Overlay:
  circle w0.25: c-12.099,11.299 r0.125
  region: -10.933,11.449 -11.449,10.933 -11.449,11.449
  lines w0.2: -11.449,10.933 -10.933,11.449 ; -11.449,-11.551 -11.449,11.449 11.551,11.449 11.551,-11.551 -11.449,-11.551
Mechanical 13:
  lines w0.1: -11.449,-11.551 -11.449,11.449 11.551,11.449 11.551,-11.551 -11.449,-11.551
Mechanical 15:
  lines w0.05: -11.949,-12.051 -11.949,11.949 12.051,11.949 12.051,-12.051 -11.949,-12.051
  lines w0.1: -0.449,-0.051 0.551,-0.051 ; 0.051,-0.551 0.051,0.449
3D body: height 1.85, standoff 0.35, extent -11.449,-11.551 11.551,11.449
3D body: height 1.9, standoff 0.4, extent -10.887,10.015 -10.09,10.813

## BGA672_1.0(27x27) [mm]
height 0.65
pads (672):
  round 0.5 smd: A2(-11.525,12.5) A3(-10.525,12.5) A4(-9.525,12.5) A5(-8.525,12.5) A6(-7.525,12.5) A7(-6.525,12.5) A8(-5.525,12.5) A9(-4.525,12.5) A10(-3.525,12.5) A11(-2.525,12.5) A12(-1.525,12.5) A13(-0.525,12.5) A14(0.475,12.5) A15(1.475,12.5) A16(2.475,12.5) A17(3.475,12.5) A18(4.475,12.5) A19(5.475,12.5) A20(6.475,12.5) A21(7.475,12.5) A22(8.475,12.5) A23(9.475,12.5) A24(10.475,12.5) A25(11.475,12.5) AA1(-12.525,-7.5) AA2(-11.525,-7.5) AA3(-10.525,-7.5) AA4(-9.525,-7.5) AA5(-8.525,-7.5) AA6(-7.525,-7.5) AA7(-6.525,-7.5) AA8(-5.525,-7.5) AA9(-4.525,-7.5) AA10(-3.525,-7.5) AA11(-2.525,-7.5) AA12(-1.525,-7.5) AA13(-0.525,-7.5) AA14(0.475,-7.5) AA15(1.475,-7.5) AA16(2.475,-7.5) AA17(3.475,-7.5) AA18(4.475,-7.5) AA19(5.475,-7.5) AA20(6.475,-7.5) AA21(7.475,-7.5) AA22(8.475,-7.5) AA23(9.475,-7.5) AA24(10.475,-7.5) AA25(11.475,-7.5) AA26(12.475,-7.5) AB1(-12.525,-8.5) AB2(-11.525,-8.5) AB3(-10.525,-8.5) AB4(-9.525,-8.5) AB5(-8.525,-8.5) AB6(-7.525,-8.5) AB7(-6.525,-8.5) AB8(-5.525,-8.5) AB9(-4.525,-8.5) AB10(-3.525,-8.5) AB11(-2.525,-8.5) AB12(-1.525,-8.5) AB13(-0.525,-8.5) AB14(0.475,-8.5) AB15(1.475,-8.5) AB16(2.475,-8.5) AB17(3.475,-8.5) AB18(4.475,-8.5) AB19(5.475,-8.5) AB20(6.475,-8.5) AB21(7.475,-8.5) AB22(8.475,-8.5) AB23(9.475,-8.5) AB24(10.475,-8.5) AB25(11.475,-8.5) AB26(12.475,-8.5) AC1(-12.525,-9.5) AC2(-11.525,-9.5) AC3(-10.525,-9.5) AC4(-9.525,-9.5) AC5(-8.525,-9.5) AC6(-7.525,-9.5) AC7(-6.525,-9.5) AC8(-5.525,-9.5) AC9(-4.525,-9.5) AC10(-3.525,-9.5) AC11(-2.525,-9.5) AC12(-1.525,-9.5) AC13(-0.525,-9.5) AC14(0.475,-9.5) AC15(1.475,-9.5) AC16(2.475,-9.5) AC17(3.475,-9.5) AC18(4.475,-9.5) AC19(5.475,-9.5) AC20(6.475,-9.5) AC21(7.475,-9.5) AC22(8.475,-9.5) AC23(9.475,-9.5) AC24(10.475,-9.5) AC25(11.475,-9.5) AC26(12.475,-9.5) AD1(-12.525,-10.5) AD2(-11.525,-10.5) AD3(-10.525,-10.5) AD4(-9.525,-10.5) AD5(-8.525,-10.5) AD6(-7.525,-10.5) AD7(-6.525,-10.5) AD8(-5.525,-10.5) AD9(-4.525,-10.5) AD10(-3.525,-10.5) AD11(-2.525,-10.5) AD12(-1.525,-10.5) AD13(-0.525,-10.5) AD14(0.475,-10.5) AD15(1.475,-10.5) AD16(2.475,-10.5) AD17(3.475,-10.5) AD18(4.475,-10.5) AD19(5.475,-10.5) AD20(6.475,-10.5) AD21(7.475,-10.5) AD22(8.475,-10.5) AD23(9.475,-10.5) AD24(10.475,-10.5) AD25(11.475,-10.5) AD26(12.475,-10.5) AE1(-12.525,-11.5) AE2(-11.525,-11.5) AE3(-10.525,-11.5) AE4(-9.525,-11.5) AE5(-8.525,-11.5) AE6(-7.525,-11.5) AE7(-6.525,-11.5) AE8(-5.525,-11.5) AE9(-4.525,-11.5) AE10(-3.525,-11.5) AE11(-2.525,-11.5) AE12(-1.525,-11.5) AE13(-0.525,-11.5) AE14(0.475,-11.5) AE15(1.475,-11.5) AE16(2.475,-11.5) AE17(3.475,-11.5) AE18(4.475,-11.5) AE19(5.475,-11.5) AE20(6.475,-11.5) AE21(7.475,-11.5) AE22(8.475,-11.5) AE23(9.475,-11.5) AE24(10.475,-11.5) AE25(11.475,-11.5) AE26(12.475,-11.5) AF2(-11.525,-12.5) AF3(-10.525,-12.5) AF4(-9.525,-12.5) AF5(-8.525,-12.5) AF6(-7.525,-12.5) AF7(-6.525,-12.5) AF8(-5.525,-12.5) AF9(-4.525,-12.5) AF10(-3.525,-12.5) AF11(-2.525,-12.5) AF12(-1.525,-12.5) AF13(-0.525,-12.5) AF14(0.475,-12.5) AF15(1.475,-12.5) AF16(2.475,-12.5) AF17(3.475,-12.5) AF18(4.475,-12.5) AF19(5.475,-12.5) AF20(6.475,-12.5) AF21(7.475,-12.5) AF22(8.475,-12.5) AF23(9.475,-12.5) AF24(10.475,-12.5) AF25(11.475,-12.5) B1(-12.525,11.5) B2(-11.525,11.5) B3(-10.525,11.5) B4(-9.525,11.5) B5(-8.525,11.5) B6(-7.525,11.5) B7(-6.525,11.5) B8(-5.525,11.5) B9(-4.525,11.5) B10(-3.525,11.5) B11(-2.525,11.5) B12(-1.525,11.5) B13(-0.525,11.5) B14(0.475,11.5) B15(1.475,11.5) B16(2.475,11.5) B17(3.475,11.5) B18(4.475,11.5) B19(5.475,11.5) B20(6.475,11.5) B21(7.475,11.5) B22(8.475,11.5) B23(9.475,11.5) B24(10.475,11.5) B25(11.475,11.5) B26(12.475,11.5) C1(-12.525,10.5) C2(-11.525,10.5) C3(-10.525,10.5) C4(-9.525,10.5) C5(-8.525,10.5) C6(-7.525,10.5) C7(-6.525,10.5) C8(-5.525,10.5) C9(-4.525,10.5) C10(-3.525,10.5) C11(-2.525,10.5) C12(-1.525,10.5) C13(-0.525,10.5) C14(0.475,10.5) C15(1.475,10.5) C16(2.475,10.5) C17(3.475,10.5) C18(4.475,10.5) C19(5.475,10.5) C20(6.475,10.5) C21(7.475,10.5) C22(8.475,10.5) C23(9.475,10.5) C24(10.475,10.5) C25(11.475,10.5) C26(12.475,10.5) D1(-12.525,9.5) D2(-11.525,9.5) D3(-10.525,9.5) D4(-9.525,9.5) D5(-8.525,9.5) D6(-7.525,9.5) D7(-6.525,9.5) D8(-5.525,9.5) D9(-4.525,9.5) D10(-3.525,9.5) D11(-2.525,9.5) D12(-1.525,9.5) D13(-0.525,9.5) D14(0.475,9.5) D15(1.475,9.5) D16(2.475,9.5) D17(3.475,9.5) D18(4.475,9.5) D19(5.475,9.5) D20(6.475,9.5) D21(7.475,9.5) D22(8.475,9.5) D23(9.475,9.5) D24(10.475,9.5) D25(11.475,9.5) D26(12.475,9.5) E1(-12.525,8.5) E2(-11.525,8.5) E3(-10.525,8.5) E4(-9.525,8.5) E5(-8.525,8.5) E6(-7.525,8.5) E7(-6.525,8.5) E8(-5.525,8.5) E9(-4.525,8.5) E10(-3.525,8.5) E11(-2.525,8.5) E12(-1.525,8.5) E13(-0.525,8.5) E14(0.475,8.5) E15(1.475,8.5) E16(2.475,8.5) E17(3.475,8.5) E18(4.475,8.5) E19(5.475,8.5) E20(6.475,8.5) E21(7.475,8.5) E22(8.475,8.5) E23(9.475,8.5) E24(10.475,8.5) E25(11.475,8.5) E26(12.475,8.5) F1(-12.525,7.5) F2(-11.525,7.5) F3(-10.525,7.5) F4(-9.525,7.5) F5(-8.525,7.5) F6(-7.525,7.5) F7(-6.525,7.5) F8(-5.525,7.5) F9(-4.525,7.5) F10(-3.525,7.5) F11(-2.525,7.5) F12(-1.525,7.5) F13(-0.525,7.5) F14(0.475,7.5) F15(1.475,7.5) F16(2.475,7.5) F17(3.475,7.5) F18(4.475,7.5) F19(5.475,7.5) F20(6.475,7.5) F21(7.475,7.5) F22(8.475,7.5) F23(9.475,7.5) F24(10.475,7.5) F25(11.475,7.5) F26(12.475,7.5) G1(-12.525,6.5) G2(-11.525,6.5) G3(-10.525,6.5) G4(-9.525,6.5) G5(-8.525,6.5) G6(-7.525,6.5) G7(-6.525,6.5) G8(-5.525,6.5) G9(-4.525,6.5) G10(-3.525,6.5) G11(-2.525,6.5) G12(-1.525,6.5) G13(-0.525,6.5) G14(0.475,6.5) G15(1.475,6.5) G16(2.475,6.5) G17(3.475,6.5) G18(4.475,6.5) G19(5.475,6.5) G20(6.475,6.5) G21(7.475,6.5) G22(8.475,6.5) G23(9.475,6.5) G24(10.475,6.5) G25(11.475,6.5) G26(12.475,6.5) H1(-12.525,5.5) H2(-11.525,5.5) H3(-10.525,5.5) H4(-9.525,5.5) H5(-8.525,5.5) H6(-7.525,5.5) H7(-6.525,5.5) H8(-5.525,5.5) H9(-4.525,5.5) H10(-3.525,5.5) H11(-2.525,5.5) H12(-1.525,5.5) H13(-0.525,5.5) H14(0.475,5.5) H15(1.475,5.5) H16(2.475,5.5) H17(3.475,5.5) H18(4.475,5.5) H19(5.475,5.5) H20(6.475,5.5) H21(7.475,5.5) H22(8.475,5.5) H23(9.475,5.5) H24(10.475,5.5) H25(11.475,5.5) H26(12.475,5.5) J1(-12.525,4.5) J2(-11.525,4.5) J3(-10.525,4.5) J4(-9.525,4.5) J5(-8.525,4.5) J6(-7.525,4.5) J7(-6.525,4.5) J8(-5.525,4.5) J9(-4.525,4.5) J10(-3.525,4.5) J11(-2.525,4.5) J12(-1.525,4.5) J13(-0.525,4.5) J14(0.475,4.5) J15(1.475,4.5) J16(2.475,4.5) J17(3.475,4.5) J18(4.475,4.5) J19(5.475,4.5) J20(6.475,4.5) J21(7.475,4.5) J22(8.475,4.5) J23(9.475,4.5) J24(10.475,4.5) J25(11.475,4.5) J26(12.475,4.5) K1(-12.525,3.5) K2(-11.525,3.5) K3(-10.525,3.5) K4(-9.525,3.5) K5(-8.525,3.5) K6(-7.525,3.5) K7(-6.525,3.5) K8(-5.525,3.5) K9(-4.525,3.5) K10(-3.525,3.5) K11(-2.525,3.5) K12(-1.525,3.5) K13(-0.525,3.5) K14(0.475,3.5) K15(1.475,3.5) K16(2.475,3.5) K17(3.475,3.5) K18(4.475,3.5) K19(5.475,3.5) K20(6.475,3.5) K21(7.475,3.5) K22(8.475,3.5) K23(9.475,3.5) K24(10.475,3.5) K25(11.475,3.5) K26(12.475,3.5) L1(-12.525,2.5) L2(-11.525,2.5) L3(-10.525,2.5) L4(-9.525,2.5) L5(-8.525,2.5) L6(-7.525,2.5) L7(-6.525,2.5) L8(-5.525,2.5) L9(-4.525,2.5) L10(-3.525,2.5) L11(-2.525,2.5) L12(-1.525,2.5) L13(-0.525,2.5) L14(0.475,2.5) L15(1.475,2.5) L16(2.475,2.5) L17(3.475,2.5) L18(4.475,2.5) L19(5.475,2.5) L20(6.475,2.5) L21(7.475,2.5) L22(8.475,2.5) L23(9.475,2.5) L24(10.475,2.5) L25(11.475,2.5) L26(12.475,2.5) M1(-12.525,1.5) M2(-11.525,1.5) M3(-10.525,1.5) M4(-9.525,1.5) M5(-8.525,1.5) M6(-7.525,1.5) M7(-6.525,1.5) M8(-5.525,1.5) M9(-4.525,1.5) M10(-3.525,1.5) M11(-2.525,1.5) M12(-1.525,1.5) M13(-0.525,1.5) M14(0.475,1.5) M15(1.475,1.5) M16(2.475,1.5) M17(3.475,1.5) M18(4.475,1.5) M19(5.475,1.5) M20(6.475,1.5) M21(7.475,1.5) M22(8.475,1.5) M23(9.475,1.5) M24(10.475,1.5) M25(11.475,1.5) M26(12.475,1.5) N1(-12.525,0.5) N2(-11.525,0.5) N3(-10.525,0.5) N4(-9.525,0.5) N5(-8.525,0.5) N6(-7.525,0.5) N7(-6.525,0.5) N8(-5.525,0.5) N9(-4.525,0.5) N10(-3.525,0.5) N11(-2.525,0.5) N12(-1.525,0.5) N13(-0.525,0.5) N14(0.475,0.5) N15(1.475,0.5) N16(2.475,0.5) N17(3.475,0.5) N18(4.475,0.5) N19(5.475,0.5) N20(6.475,0.5) N21(7.475,0.5) N22(8.475,0.5) N23(9.475,0.5) N24(10.475,0.5) N25(11.475,0.5) N26(12.475,0.5) P1(-12.525,-0.5) P2(-11.525,-0.5) P3(-10.525,-0.5) P4(-9.525,-0.5) P5(-8.525,-0.5) P6(-7.525,-0.5) P7(-6.525,-0.5) P8(-5.525,-0.5) P9(-4.525,-0.5) P10(-3.525,-0.5) P11(-2.525,-0.5) P12(-1.525,-0.5) P13(-0.525,-0.5) P14(0.475,-0.5) P15(1.475,-0.5) P16(2.475,-0.5) P17(3.475,-0.5) P18(4.475,-0.5) P19(5.475,-0.5) P20(6.475,-0.5) P21(7.475,-0.5) P22(8.475,-0.5) P23(9.475,-0.5) P24(10.475,-0.5) P25(11.475,-0.5) P26(12.475,-0.5) R1(-12.525,-1.5) R2(-11.525,-1.5) R3(-10.525,-1.5) R4(-9.525,-1.5) R5(-8.525,-1.5) R6(-7.525,-1.5) R7(-6.525,-1.5) R8(-5.525,-1.5) R9(-4.525,-1.5) R10(-3.525,-1.5) R11(-2.525,-1.5) R12(-1.525,-1.5) R13(-0.525,-1.5) R14(0.475,-1.5) R15(1.475,-1.5) R16(2.475,-1.5) R17(3.475,-1.5) R18(4.475,-1.5) R19(5.475,-1.5) R20(6.475,-1.5) R21(7.475,-1.5) R22(8.475,-1.5) R23(9.475,-1.5) R24(10.475,-1.5) R25(11.475,-1.5) R26(12.475,-1.5) T1(-12.525,-2.5) T2(-11.525,-2.5) T3(-10.525,-2.5) T4(-9.525,-2.5) T5(-8.525,-2.5) T6(-7.525,-2.5) T7(-6.525,-2.5) T8(-5.525,-2.5) T9(-4.525,-2.5) T10(-3.525,-2.5) T11(-2.525,-2.5) T12(-1.525,-2.5) T13(-0.525,-2.5) T14(0.475,-2.5) T15(1.475,-2.5) T16(2.475,-2.5) T17(3.475,-2.5) T18(4.475,-2.5) T19(5.475,-2.5) T20(6.475,-2.5) T21(7.475,-2.5) T22(8.475,-2.5) T23(9.475,-2.5) T24(10.475,-2.5) T25(11.475,-2.5) T26(12.475,-2.5) U1(-12.525,-3.5) U2(-11.525,-3.5) U3(-10.525,-3.5) U4(-9.525,-3.5) U5(-8.525,-3.5) U6(-7.525,-3.5) U7(-6.525,-3.5) U8(-5.525,-3.5) U9(-4.525,-3.5) U10(-3.525,-3.5) U11(-2.525,-3.5) U12(-1.525,-3.5) U13(-0.525,-3.5) U14(0.475,-3.5) U15(1.475,-3.5) U16(2.475,-3.5) U17(3.475,-3.5) U18(4.475,-3.5) U19(5.475,-3.5) U20(6.475,-3.5) U21(7.475,-3.5) U22(8.475,-3.5) U23(9.475,-3.5) U24(10.475,-3.5) U25(11.475,-3.5) U26(12.475,-3.5) V1(-12.525,-4.5) V2(-11.525,-4.5) V3(-10.525,-4.5) V4(-9.525,-4.5) V5(-8.525,-4.5) V6(-7.525,-4.5) V7(-6.525,-4.5) V8(-5.525,-4.5) V9(-4.525,-4.5) V10(-3.525,-4.5) V11(-2.525,-4.5) V12(-1.525,-4.5) V13(-0.525,-4.5) V14(0.475,-4.5) V15(1.475,-4.5) V16(2.475,-4.5) V17(3.475,-4.5) V18(4.475,-4.5) V19(5.475,-4.5) V20(6.475,-4.5) V21(7.475,-4.5) V22(8.475,-4.5) V23(9.475,-4.5) V24(10.475,-4.5) V25(11.475,-4.5) V26(12.475,-4.5) W1(-12.525,-5.5) W2(-11.525,-5.5) W3(-10.525,-5.5) W4(-9.525,-5.5) W5(-8.525,-5.5) W6(-7.525,-5.5) W7(-6.525,-5.5) W8(-5.525,-5.5) W9(-4.525,-5.5) W10(-3.525,-5.5) W11(-2.525,-5.5) W12(-1.525,-5.5) W13(-0.525,-5.5) W14(0.475,-5.5) W15(1.475,-5.5) W16(2.475,-5.5) W17(3.475,-5.5) W18(4.475,-5.5) W19(5.475,-5.5) W20(6.475,-5.5) W21(7.475,-5.5) W22(8.475,-5.5) W23(9.475,-5.5) W24(10.475,-5.5) W25(11.475,-5.5) W26(12.475,-5.5) Y1(-12.525,-6.5) Y2(-11.525,-6.5) Y3(-10.525,-6.5) Y4(-9.525,-6.5) Y5(-8.525,-6.5) Y6(-7.525,-6.5) Y7(-6.525,-6.5) Y8(-5.525,-6.5) Y9(-4.525,-6.5) Y10(-3.525,-6.5) Y11(-2.525,-6.5) Y12(-1.525,-6.5) Y13(-0.525,-6.5) Y14(0.475,-6.5) Y15(1.475,-6.5) Y16(2.475,-6.5) Y17(3.475,-6.5) Y18(4.475,-6.5) Y19(5.475,-6.5) Y20(6.475,-6.5) Y21(7.475,-6.5) Y22(8.475,-6.5) Y23(9.475,-6.5) Y24(10.475,-6.5) Y25(11.475,-6.5) Y26(12.475,-6.5)
Top Overlay:
  circle w0.25: c-14.175,13.35 r0.125
  region: -12.525,13.5 -13.525,12.5 -13.525,13.5
  lines w0.2: -13.525,12.5 -12.525,13.5 ; -13.525,-13.5 13.475,-13.5 13.475,13.5 -13.525,13.5 -13.525,-13.5
Mechanical 13:
  lines w0.1: -13.525,-13.5 13.475,-13.5 13.475,13.5 -13.525,13.5 -13.525,-13.5
Mechanical 15:
  lines w0.05: -14.025,-14 13.975,-14 13.975,14 -14.025,14 -14.025,-14
  lines w0.1: -0.525,0 0.475,0 ; -0.025,-0.5 -0.025,0.5
3D body "BGA676C100P26X26_2700X2700X200.step": height 2, standoff 0, extent -13.525,-13.5 13.475,13.5